# Altium footprint library AD_Lib.PcbLib: 508 footprints (part 27 of 32)
Each footprint in its own frame and in the unit in brackets; x right, y up, seen from the top. Pads: shape width x height; smd on the part's side, far side on the other; paste and mask are expansions set on the pad; w line width, h text height; cw(c..) or ccw(c..) is an arc to the next point about the centre after c.
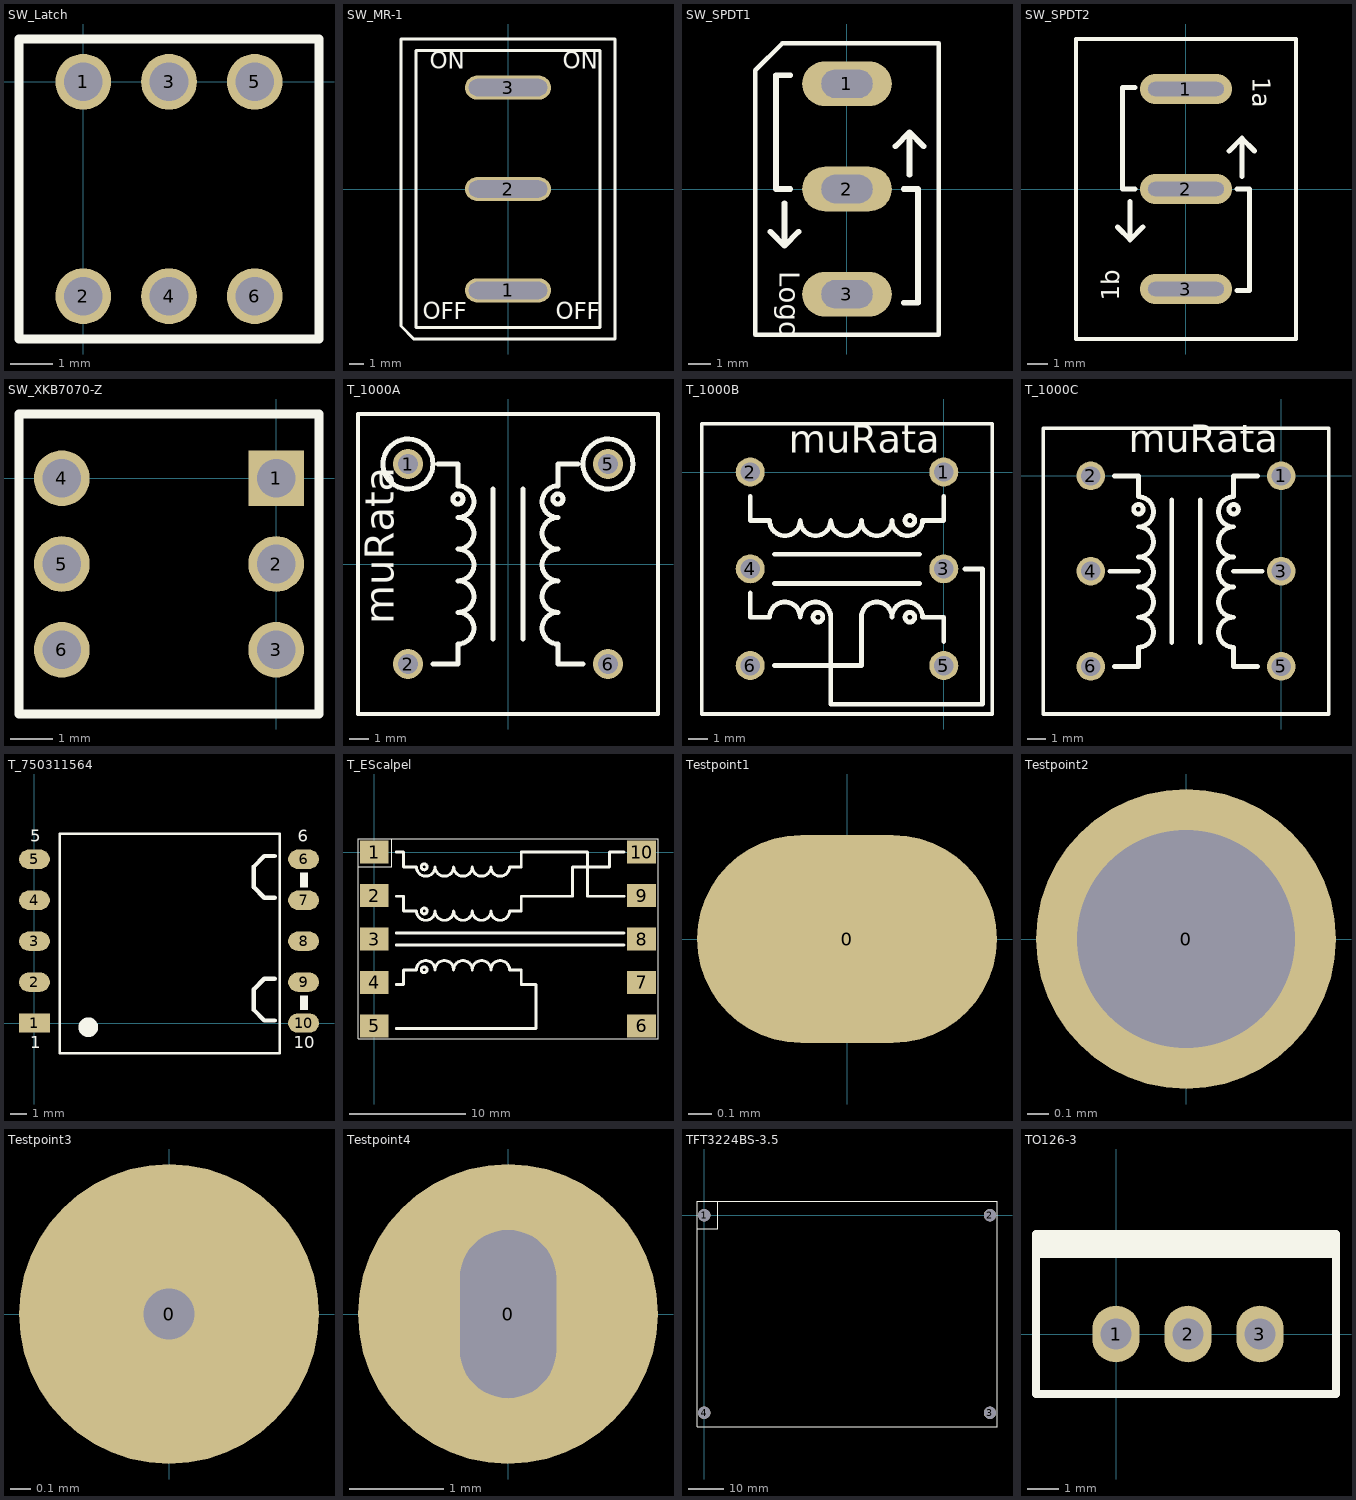
[diagram p26: the footprints below, top view; thin cyan lines are the x and y axes]

## SW_Latch [mm] "7*7mm自锁开关"
height 12.2
pads (6):
  round 1.3 hole 0.9: 1(0,0) 2(0,-5) 3(2,0) 4(2,-5) 5(4,0) 6(4,-5)
Top Overlay:
  lines w0.2: -1.5,-6 5.5,-6 5.5,1 -1.5,1 -1.5,-6

## SW_MR-1 [mm] "单刀单掷开关（船型），引脚间距7.1mm；"
height 12.3
pads (3):
  oval 6x1.7 hole 1.2 slot 5.5 at 0 deg: 1(0,-7.1) 2(0,0) 3(0,7.1)
Top Overlay:
  lines w0.2: -7.5,-9.594 -7.5,10.5 7.5,10.5 7.5,-10.5 -6.594,-10.5 -7.5,-9.594 ; -6.45,-9.7 -6.45,9.7 6.45,9.7 6.45,-9.7 -6.45,-9.7
  text "ON" at -5.461,8.001 h2.03
  text "OFF" at -5.969,-9.525 h2.03
  text "OFF" at 3.327,-9.525 h2.03
  text "ON" at 3.835,8.001 h2.03

## SW_SPDT1 [mm] "单刀双掷开关（摇杆），引脚间距4.7mm；KNX102A"
height 30
pads (3):
  oval 4x2 hole 1.27 slot 2.286 at 0 deg: 1(0,4.7) 2(0,0) 3(0,-4.7)
Top Overlay:
  lines w0.2: -4.1,-6.5 -4.1,5.298 -2.898,6.5 4.1,6.5 4.1,-6.5 -4.1,-6.5
  lines w0.254: -3.429,-1.905 -2.794,-2.54 ; -2.794,-0.635 -2.794,-2.54 ; -2.54,0 -3.175,0 -3.175,5.08 -2.54,5.08 ; -2.159,-1.905 -2.794,-2.54 ; 2.159,1.905 2.794,2.54 ; 2.54,-5.08 3.175,-5.08 3.175,0 2.54,0 ; 2.794,0.635 2.794,2.54 ; 3.429,1.905 2.794,2.54
  text "Logo" at -3.302,-3.683 h1.52

## SW_SPDT2 [mm] "单刀双掷开关（船型），引脚间距5mm；"
height 13.5
pads (3):
  oval 4.6x1.5 hole 0.7 slot 3.8 at 0 deg: 1(0,5) 2(0,0) 3(0,-5)
Top Overlay:
  lines w0.2: -5.5,-7.5 5.5,-7.5 5.5,7.5 -5.5,7.5 -5.5,-7.5
  lines w0.254: -3.429,-1.905 -2.794,-2.54 ; -2.794,-0.635 -2.794,-2.54 ; -2.54,0 -3.175,0 -3.175,5.08 -2.54,5.08 ; -2.159,-1.905 -2.794,-2.54 ; 2.159,1.905 2.794,2.54 ; 2.54,-5.08 3.175,-5.08 3.175,0 2.54,0 ; 2.794,0.635 2.794,2.54 ; 3.429,1.905 2.794,2.54
  text "1a" at 3.048,5.588 h1.52
  text "1b" at -3.048,-5.588 h1.52

## SW_XKB7070-Z [mm] "XKB之7*7mm 自锁开关，六脚"
height 12.5
pads (6):
  rect 1.3x1.3 hole 0.9: 1(0,0)
  round 1.3 hole 0.9: 2(0,-2) 3(0,-4) 4(-5,0) 5(-5,-2) 6(-5,-4)
Top Overlay:
  lines w0.2: -6,-5.5 1,-5.5 1,1.5 -6,1.5 -6,-5.5
Bottom Overlay:
  lines w0.152: -4.111,-4 -3.095,-4 -3.095,-2.61 ; -4.111,-1.905 -3.73,-1.905 -2.841,-2.794 ; -4.111,0 -3.095,0 -3.095,-1.39 ; -2.159,-2.794 -1.27,-1.905 -0.889,-1.905 ; -1.905,-2.61 -1.905,-4 -0.889,-4 ; -1.905,-1.39 -1.905,0 -0.889,0

## T_1000A [mil] "Murata脉冲变压器，1000系列"
height 620
pads (4):
  round 60 hole 40: 1(-200,200) 2(-200,-200) 5(200,200) 6(200,-200)
Top Overlay:
  circle w10: c100,130 r10
  circle w10: c-100,130 r10
  circle w10: c200,200 r50
  circle w10: c-200,200 r50
  lines w7.87: -300,-300 -300,300 300,300 300,-300 -300,-300
  lines w10: -150,-200 -100,-200 -100,-160 ccw(c-100,-128.38) -100,-96.75 ccw(c-100,-65.13) -100,-33.51 ccw(c-100,-1.89) -100,29.74 ccw(c-100,61.36) -100,92.98 ccw(c-100,124.61) -100,156.23 -100,200 -140,200 ; -30,-150 -30,150 ; 30,-150 30,150 ; 140,200 100,200 100,156.23 ccw(c100,124.61) 100,92.98 ccw(c100,61.36) 100,29.74 ccw(c100,-1.89) 100,-33.51 ccw(c100,-65.13) 100,-96.75 ccw(c100,-128.38) 100,-160 100,-200 150,-200
  text "muRata" at -210,-120 h100
Bottom Overlay:
  circle w10: c100,130 r10
  circle w10: c-100,130 r10
  circle w10: c-200,200 r50
  circle w10: c200,200 r50
  lines w10: -150,-200 -100,-200 -100,-160 ccw(c-100,-128.38) -100,-96.75 ccw(c-100,-65.13) -100,-33.51 ccw(c-100,-1.89) -100,29.74 ccw(c-100,61.36) -100,92.98 ccw(c-100,124.61) -100,156.23 -100,200 -140,200 ; -30,-150 -30,150 ; 30,-150 30,150 ; 140,200 100,200 100,156.23 ccw(c100,124.61) 100,92.98 ccw(c100,61.36) 100,29.74 ccw(c100,-1.89) 100,-33.51 ccw(c100,-65.13) 100,-96.75 ccw(c100,-128.38) 100,-160 100,-200 150,-200
  text "5" at 180,70 h100
  text "1" at -180,70 h100
  text "6" at 180,-150 h100
  text "2" at -220,-150 h100

## T_1000B [mil] "Murata脉冲变压器，1000系列"
height 620
pads (6):
  round 60 hole 40: 1(0,0) 2(-400,0) 3(0,-200) 4(-400,-200) 5(0,-400) 6(-400,-400)
Top Overlay:
  circle w10: c-70,-100 r10
  circle w10: c-70,-300 r10
  circle w10: c-260,-300 r10
  lines w7.87: -500,-500 100,-500 100,100 -500,100 -500,-500
  lines w10: -400,-250 -400,-300 -360,-300 cw(c-328.38,-300) -296.75,-300 cw(c-265.13,-300) -233.51,-300 -233.51,-480 80,-480 80,-200 43.51,-200 ; -400,-50 -400,-100 -360,-100 ccw(c-328.38,-100) -296.75,-100 ccw(c-265.13,-100) -233.51,-100 ccw(c-201.89,-100) -170.26,-100 ccw(c-138.64,-100) -107.02,-100 ccw(c-75.39,-100) -43.77,-100 0,-100 0,-50 ; -350,-400 -180,-400 -170,-400 -170.26,-399.74 -170.26,-300 cw(c-138.64,-300) -107.02,-300 cw(c-75.39,-300) -43.77,-300 0,-300 0,-350 ; -350,-230 -50,-230 ; -350,-170 -50,-170
  text "muRata" at -320,20 h100
Bottom Overlay:
  circle w10: c-70,-100 r10
  circle w10: c-70,-300 r10
  circle w10: c-260,-300 r10
  lines w10: -400,-250 -400,-300 -360,-300 cw(c-328.38,-300) -296.75,-300 cw(c-265.13,-300) -233.51,-300 -233.51,-480 80,-480 80,-200 43.51,-200 ; -400,-50 -400,-100 -360,-100 ccw(c-328.38,-100) -296.75,-100 ccw(c-265.13,-100) -233.51,-100 ccw(c-201.89,-100) -170.26,-100 ccw(c-138.64,-100) -107.02,-100 ccw(c-75.39,-100) -43.77,-100 0,-100 0,-50 ; -350,-400 -170.26,-400 ; -350,-230 -50,-230 ; -350,-170 -50,-170 ; -170.26,-399.74 -170.26,-300 cw(c-138.64,-300) -107.02,-300 cw(c-75.39,-300) -43.77,-300 0,-300 0,-350
  text "2" at -450,-20 h60
  text "4" at -450,-220 h60
  text "6" at -450,-420 h60
  text "5" at -50,-420 h60
  text "3" at 10,-280 h60
  text "1" at 80,-20 h60

## T_1000C [mil] "Murata脉冲变压器，1000系列"
height 620
pads (6):
  round 60 hole 40: 1(0,0) 2(-400,0) 3(0,-200) 4(-400,-200) 5(0,-400) 6(-400,-400)
Top Overlay:
  circle w10: c-300,-70 r10
  circle w10: c-100,-70 r10
  lines w7.87: -500,-500 100,-500 100,100 -500,100 -500,-500
  lines w10: -360,-200 -300,-200 ; -350,-400 -300,-400 -300,-360 ccw(c-300,-328.38) -300,-296.75 ccw(c-300,-265.13) -300,-233.51 ccw(c-300,-201.89) -300,-170.26 ccw(c-300,-138.64) -300,-107.02 ccw(c-300,-75.39) -300,-43.77 -300,0 -350,0 ; -230,-350 -230,-50 ; -170,-350 -170,-50 ; -100,-200 -40,-200 ; -50,-400 -100,-400 -100,-360 cw(c-100,-328.38) -100,-296.75 cw(c-100,-265.13) -100,-233.51 cw(c-100,-201.89) -100,-170.26 cw(c-100,-138.64) -100,-107.02 cw(c-100,-75.39) -100,-43.77 -100,0 -50,0
  text "muRata" at -320,30 h100
Bottom Overlay:
  circle w10: c-300,-70 r10
  circle w10: c-100,-70 r10
  lines w10: -360,-200 -300,-200 ; -350,-400 -300,-400 -300,-360 ccw(c-300,-328.38) -300,-296.75 ccw(c-300,-265.13) -300,-233.51 ccw(c-300,-201.89) -300,-170.26 ccw(c-300,-138.64) -300,-107.02 ccw(c-300,-75.39) -300,-43.77 -300,0 -350,0 ; -230,-350 -230,-50 ; -170,-350 -170,-50 ; -100,-200 -40,-200 ; -50,-400 -100,-400 -100,-360 cw(c-100,-328.38) -100,-296.75 cw(c-100,-265.13) -100,-233.51 cw(c-100,-201.89) -100,-170.26 cw(c-100,-138.64) -100,-107.02 cw(c-100,-75.39) -100,-43.77 -100,0 -50,0
  text "2" at -390,-90 h60
  text "1" at 10,-90 h60
  text "3" at 10,-290 h60
  text "4" at -390,-290 h60
  text "5" at 10,-490 h60
  text "6" at -390,-490 h60

## T_750311564 [mm] "Wurth之音频变压器"
height 18
pads (10):
  rect 1.88x1.168 smd mask+0.2: 1(0,0)
  oval 1.88x1.17 smd mask+0.2: 2(0,2.489) 3(0,4.978) 4(0,7.468) 5(0,9.957) 6(16.358,9.957) 7(16.358,7.468) 8(16.358,4.978) 9(16.358,2.489) 10(16.358,0)
Top Overlay:
  circle w0.6: c3.269,-0.253 r0.3
  rectangle: 16.129,0.787 16.637,1.676
  rectangle: 16.129,8.255 16.637,9.144
  lines w0.152: 1.524,-1.843 1.524,11.497 6.109,11.497 14.91,11.497 14.91,-1.843 1.524,-1.843
  lines w0.254: 14.605,0.152 13.97,0.152 13.335,0.787 13.335,2.057 13.97,2.692 14.605,2.692 ; 14.605,7.62 13.97,7.62 13.335,8.255 13.335,9.525 13.97,10.16 14.605,10.16
  text "1" at -0.254,-1.778 h1.27
  text "5" at -0.254,10.795 h1.27
  text "10" at 15.748,-1.778 h1.27
  text "6" at 16.002,10.795 h1.27

## T_EScalpel [mil] "科惠手持式超声刀用变压器，专利号：EP2510891B1"
pads (10):
  rect 98x78 smd: 1(0,0) 2(0,-147.64) 3(0,-295.28) 4(0,-442.91) 5(0,-590.55) 6(909.45,-590.55) 7(909.45,-442.91) 8(909.45,-295.28) 9(909.45,-147.64) 10(909.45,0)
Top Overlay:
  circle w10: c170,-50 r10
  circle w10: c170,-200 r10
  circle w10: c170,-400 r10
  lines w3: -55,-50 60,-50 60,45 ; -55,-635 -55,45 955,45 965,45 965,-635 -55,-635
  lines w10: 75,-600 550,-600 550,-450 525,-450 500,-450 500,-400 460,-400 ccw(c428.38,-400) 396.75,-400 ccw(c365.13,-400) 333.51,-400 ccw(c301.89,-400) 270.26,-400 ccw(c238.64,-400) 207.02,-400 ccw(c175.39,-400) 143.77,-400 100,-400 100,-450 75,-450 ; 75,-315 850,-315 ; 75,-275 850,-275 ; 75,-150 100,-150 100,-200 143.77,-200 ccw(c175.39,-200) 207.02,-200 ccw(c238.64,-200) 270.26,-200 ccw(c301.89,-200) 333.51,-200 ccw(c365.13,-200) 396.75,-200 ccw(c428.38,-200) 460,-200 500,-200 500,-150 525,-150 675,-150 675,-50 800,-50 800,0 850,0 ; 75,0 100,0 100,-50 143.77,-50 ccw(c175.39,-50) 207.02,-50 ccw(c238.64,-50) 270.26,-50 ccw(c301.89,-50) 333.51,-50 ccw(c365.13,-50) 396.75,-50 ccw(c428.38,-50) 460,-50 500,-50 500,0 525,0 725,0 725,-150 850,-150
Bottom Overlay:
  circle w10: c170,-50 r10
  circle w10: c170,-200 r10
  circle w10: c170,-400 r10
  lines w10: 75,-600 550,-600 550,-450 525,-450 500,-450 500,-400 460,-400 ccw(c428.38,-400) 396.75,-400 ccw(c365.13,-400) 333.51,-400 ccw(c301.89,-400) 270.26,-400 ccw(c238.64,-400) 207.02,-400 ccw(c175.39,-400) 143.77,-400 100,-400 100,-450 75,-450 ; 75,-315 850,-315 ; 75,-275 850,-275 ; 75,-150 100,-150 100,-200 143.77,-200 ccw(c175.39,-200) 207.02,-200 ccw(c238.64,-200) 270.26,-200 ccw(c301.89,-200) 333.51,-200 ccw(c365.13,-200) 396.75,-200 ccw(c428.38,-200) 460,-200 500,-200 500,-150 525,-150 675,-150 675,-50 800,-50 800,0 850,0 ; 75,0 100,0 100,-50 143.77,-50 ccw(c175.39,-50) 207.02,-50 ccw(c238.64,-50) 270.26,-50 ccw(c301.89,-50) 333.51,-50 ccw(c365.13,-50) 396.75,-50 ccw(c428.38,-50) 460,-50 500,-50 500,0 525,0 675,0 725,0 725,-150 850,-150

## Testpoint1 [mm] "测试点1"
height 2.642
pads (1):
  oval 1.3x0.9 smd: 0(0,0)

## Testpoint2 [mil] "测试点2"
height 104
pads (1):
  round 55 hole 40: 0(0,0)

## Testpoint3 [mm] "测试点3"
height 2.642
pads (1):
  round 1.5 smd: 0(0,0)
via 0,0 diameter 0.508 hole 0.254

## Testpoint4 [mil] "中号测试点（美标），1.6mm"
height 220
pads (1):
  round 125 hole 40 slot 70 at 90 deg: 0(0,0)

## TFT3224BS-3.5 [mm] "TFT液晶显示屏"
height 20
pads (4):
  round 3.5 hole 3.5: 1(0,0) 2(81,0) 3(81,-56) 4(0,-56)
Top Overlay:
  lines w0.178: -2.032,-3.81 3.81,-3.81 3.81,3.937 ; -2,-60 83,-60 83,4 -2,4 -2,-60

## TO126-3 [mm]
height 5.639
pads (3):
  oval 1.5x1.8 hole 1: 1(0,0) 2(2.286,0) 3(4.572,0)
Top Overlay:
  lines w0.254: -2.54,2.286 -2.54,3.175 6.985,3.175 6.985,2.54 ; 6.985,2.54 6.985,-1.905 -1.905,-1.905 -2.54,-1.905 -2.54,-0.794 -2.54,1.429 -2.54,2.54 6.985,2.54
  lines w0.6: -2.286,2.921 6.731,2.921